# Altium footprint library ATROTECH.PcbLib: 334 footprints (part 5 of 21)
Each footprint in its own frame and in the unit in brackets; x right, y up, seen from the top. Pads: shape width x height; smd on the part's side, far side on the other; paste and mask are expansions set on the pad; w line width, h text height; cw(c..) or ccw(c..) is an arc to the next point about the centre after c.
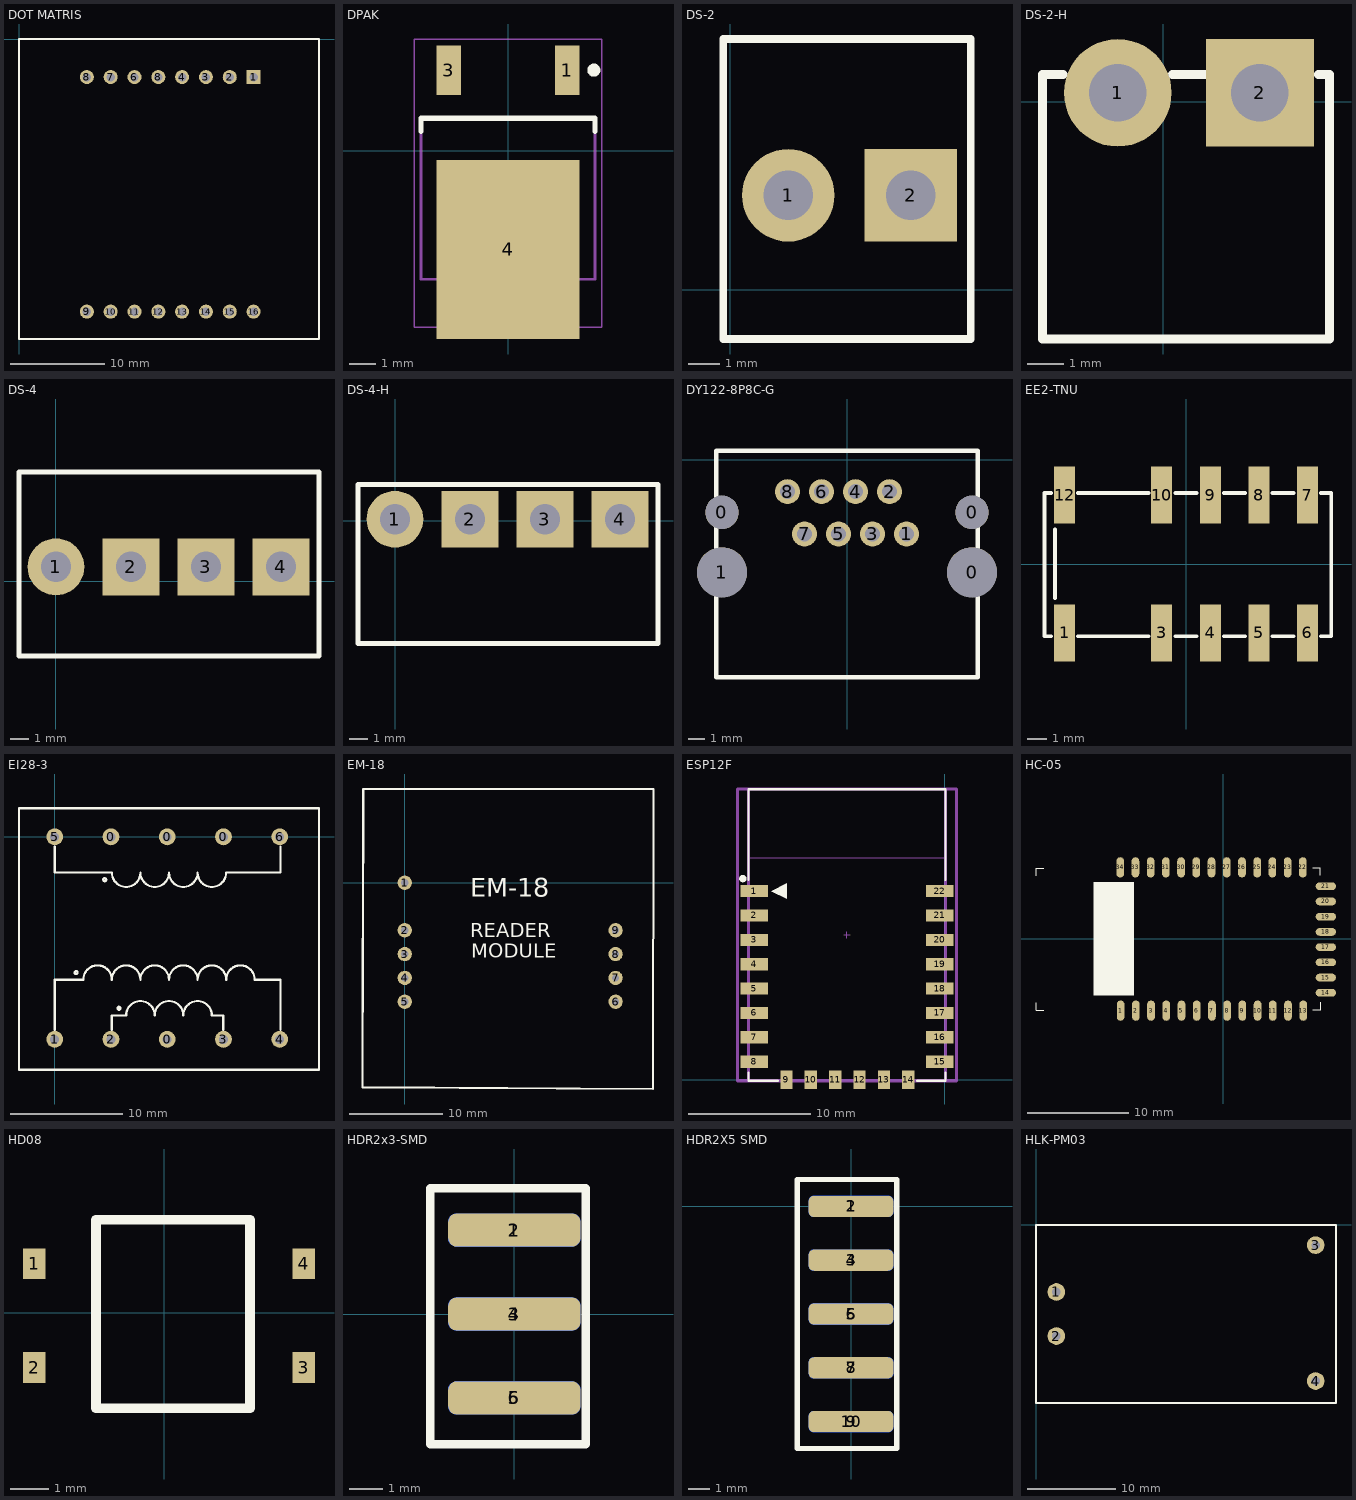
[diagram p4: the footprints below, top view; thin cyan lines are the x and y axes]

## DOT MATRIS [mm]
pads (16):
  rect 1.5x1.5 hole 0.9: 1(25.019,-4.064)
  round 1.5 hole 0.9: 2(22.479,-4.064) 3(19.939,-4.064) 4(17.399,-4.064) 6(12.319,-4.064) 7(9.779,-4.064) 8(7.239,-4.064) 8(14.859,-4.064) 9(7.239,-29.083) 10(9.779,-29.083) 11(12.319,-29.083) 12(14.859,-29.083) 13(17.399,-29.083) 14(19.939,-29.083) 15(22.479,-29.083) 16(25.019,-29.083)
Top Overlay:
  lines w0.2: 0,-32 32,-32 32,0 0,0 0,-32
3D body: height 8.25, standoff 0, extent -0.025,-32.004 32.029,0.09

## DPAK [mm]
pads (3):
  rect 0.95x1.9 smd: 1(2.28,3.1) 3(-2.28,3.1)
  rect 5.5x6.9 smd: 4(0,-3.8)
Top Overlay:
  circle w0.25: c3.305,3.1 r0.125
  lines w0.2: -3.35,0.75 -3.35,1.25 3.35,1.25 3.35,0.75
Mechanical 13:
  lines w0.1: -3.35,-4.95 -3.35,1.25 3.35,1.25 3.35,-4.95 -3.35,-4.95
Mechanical 15:
  lines w0.05: -3.6,-6.8 -3.6,4.3 3.6,4.3 3.6,-6.8 -3.6,-6.8
  lines w0.1: -0.5,-1.25 0.5,-1.25 ; 0,-1.75 0,-0.75
3D body "User Library-DPAK-1.step": height 2.34, standoff -0.07, extent -3.27,-6.528 3.27,3.411

## DS-2 [mm]
pads (2):
  round 3 hole 1.6: 1(1.87,3.048)
  rect 3x3 hole 1.6: 2(5.83,3.048)
Top Overlay:
  lines w0.254: -0.231,-1.599 -0.231,8.101 7.77,8.101 7.77,-1.599 -0.231,-1.599
3D body "User Library-Cvilux_CI5102P1V00.STEP": height 13.9, standoff -3.6, extent -0.15,-1.599 7.77,8.001

## DS-2-H [mm]
pads (2):
  round 3 hole 1.6: 1(-1.27,0.254)
  rect 3x3 hole 1.6: 2(2.69,0.254)
Top Overlay:
  lines w0.254: -2.794,0.762 -3.371,0.762 -3.371,-6.604 4.63,-6.604 4.63,0.762 4.318,0.762 ; 0.254,0.762 1.143,0.762
3D body "User Library-Cvilux_CI5102P1H00.STEP": height 9.6, standoff -3.6, extent -3.25,-18.577 4.67,0.793

## DS-4 [mm]
pads (4):
  round 3 hole 1.6: 1(0,0.762)
  rect 3x3 hole 1.6: 2(3.96,0.762) 3(7.92,0.762) 4(11.88,0.762)
Top Overlay:
  lines w0.254: -1.951,-3.937 13.889,-3.937 13.889,5.763 -1.951,5.763 -1.951,-3.937
3D body "User Library-Cvilux_CI5104P1V00.STEP": height 13.9, standoff -3.6, extent -1.951,-3.937 13.889,5.663

## DS-4-H [mm]
pads (4):
  round 3 hole 1.6: 1(-0.029,0.079)
  rect 3x3 hole 1.6: 2(3.931,0.079) 3(7.891,0.079) 4(11.851,0.079)
Top Overlay:
  lines w0.254: -1.98,-6.477 13.86,-6.477 13.86,1.905 -1.98,1.905 -1.98,-6.477
3D body "User Library-Cvilux_CI5104P1H00.STEP": height 9.6, standoff -3.6, extent -1.98,-18.704 13.86,0.666

## DY122-8P8C-G [mm]
pads (12):
  round 2 hole 2: 0(-7.502,-3.145) 0(7.498,-3.145)
  round 3 hole 3: 0(7.498,-6.745) 1(-7.502,-6.745)
  round 1.5 hole 0.9: 1(3.568,-4.445) 2(2.548,-1.905) 3(1.528,-4.445) 4(0.508,-1.905) 5(-0.512,-4.445) 6(-1.532,-1.905) 7(-2.552,-4.445) 8(-3.572,-1.905)
Top Overlay:
  lines w0.254: -7.852,-13.045 7.848,-13.045 7.848,0.555 -7.852,0.555 -7.852,-13.045

## EE2-TNU [mm]
pads (10):
  rect 1.1x3 smd: 1(-6.35,-3.61) 3(-1.27,-3.61) 4(1.27,-3.61) 5(3.81,-3.61) 6(6.35,-3.61) 7(6.35,3.61) 8(3.81,3.61) 9(1.27,3.61) 10(-1.27,3.61) 12(-6.35,3.61)
Top Overlay:
  lines w0.2: -7.05,-3.785 -7.4,-3.785 -7.4,3.71 -7.05,3.71 ; -6.85,-1.79 -6.85,1.81 ; -5.65,-3.785 -1.95,-3.785 ; -5.65,3.71 -1.95,3.71 ; -0.55,-3.785 0.55,-3.785 ; -0.55,3.71 0.55,3.71 ; 1.99,-3.785 3.09,-3.785 ; 1.99,3.71 3.09,3.71 ; 4.53,-3.785 5.63,-3.785 ; 4.53,3.71 5.63,3.71 ; 7.05,-3.785 7.6,-3.785 7.6,3.71 7.05,3.71

## EI28-3 [mm]
pads (10):
  round 1.5 hole 0.8: 0(5,0) 0(10,-18) 0(10,0) 0(15,0) 1(0,-18) 2(5,-18) 3(15,-18) 4(20,-18) 5(0,0) 6(20,0)
Top Overlay:
  circle w0.2: c4.445,-3.81 r0.127
  circle w0.2: c5.715,-15.24 r0.127
  circle w0.2: c1.905,-12.065 r0.127
  lines w0.2: 0,-17.145 0,-12.7 2.54,-12.7 cw(c3.81,-12.694) 5.08,-12.7 cw(c6.35,-12.694) 7.62,-12.7 cw(c8.89,-12.694) 10.16,-12.7 cw(c11.43,-12.694) 12.7,-12.7 cw(c13.97,-12.694) 15.24,-12.7 cw(c16.51,-12.694) 17.78,-12.7 20.066,-12.7 20.066,-17.145 ; 0,-0.889 0,-3.175 5.08,-3.175 ccw(c6.35,-3.181) 7.62,-3.175 ccw(c8.89,-3.181) 10.16,-3.175 ccw(c11.43,-3.181) 12.7,-3.175 ccw(c13.97,-3.181) 15.24,-3.175 20.066,-3.175 20.066,-0.889 ; 5.08,-17.145 5.08,-15.875 6.35,-15.875 cw(c7.62,-15.869) 8.89,-15.875 cw(c10.16,-15.869) 11.43,-15.875 cw(c12.7,-15.869) 13.97,-15.875 14.986,-15.875 14.986,-17.145 ; -3.175,-20.701 -3.175,2.54 23.495,2.54 23.495,-20.701 -3.175,-20.701

## EM-18 [mil] "RFID Reader Module"
pads (9):
  round 60 hole 30: 1(0,0) 2(0,-200) 3(0,-300) 4(0,-400) 5(0,-500) 6(885.83,-500) 7(885.83,-400) 8(885.83,-300) 9(885.83,-200)
Top Overlay:
  lines w10: 1042.91,-866.86 -177.8,-860 -175,393.7 1045,393.7 1042.92,-865
  text "MODULE" at 280,-315 h60
  text "READER" at 275,-230 h60
  text "EM-18" at 275,-60 h78.74

## ESP12F [mm]
pads (22):
  rect 2.25x1 smd: 1(-15.655,15.492) 2(-15.655,13.492) 3(-15.655,11.492) 4(-15.655,9.492) 5(-15.655,7.492) 6(-15.655,5.492) 7(-15.655,3.492) 8(-15.655,1.492) 15(-0.405,1.492) 16(-0.405,3.492) 17(-0.405,5.492) 18(-0.405,7.492) 19(-0.405,9.492) 20(-0.405,11.492) 21(-0.405,13.492) 22(-0.405,15.492)
  rect 1x1.5 smd: 9(-13,0) 10(-11,0) 11(-9,0) 12(-7,0) 13(-5,0) 14(-3,0)
Top Overlay:
  circle w0.3: c-16.58,16.517 r0.15
  region: -14.26,15.492 -12.99,14.857 -12.99,16.127
  lines w0.2: -16.114,0.576 -16.114,-0.076 -13.724,-0.076 ; -16.114,16.408 -16.114,23.863 0.054,23.863 0.054,16.408 ; -2.276,-0.076 0.054,-0.076 0.054,0.576
Mechanical 13:
  lines w0.051: -16.157,18.219 -16.157,23.874 0.099,23.874 0.099,18.219 -16.157,18.219
  lines w0.254: -16.114,-0.076 0.054,-0.076 0.054,23.863 -16.114,23.863 -16.114,-0.076
  text "CUTOUT POLYGON" at -13.6,19.3 h0.8
  text "ANTENNA AREA" at -13.081,21.209 h0.8
Mechanical 15:
  lines w0.1: -8.284,11.893 -7.776,11.893 ; -8.03,11.639 -8.03,12.147
  lines w0.254: -17.005,-0.076 -17.005,23.863 0.945,23.863 0.945,-0.076 -17.005,-0.076
3D body "ESP_12_E.STEP": height 2.75, standoff 0.04, extent -16.029,0.001 -0.029,24.001

## HC-05 [mm]
pads (34):
  oval 0.76x2 smd: 1(-10.095,-7.06) 2(-8.595,-7.06) 3(-7.095,-7.06) 4(-5.595,-7.06) 5(-4.095,-7.06) 6(-2.595,-7.06) 7(-1.095,-7.06) 8(0.405,-7.06) 9(1.905,-7.06) 10(3.405,-7.06) 11(4.905,-7.06) 12(6.405,-7.06) 13(7.905,-7.06) 22(7.865,7.06) 23(6.365,7.06) 24(4.865,7.06) 25(3.365,7.06) 26(1.865,7.06) 27(0.365,7.06) 28(-1.135,7.06) 29(-2.635,7.06) 30(-4.135,7.06) 31(-5.635,7.06) 32(-7.135,7.06) 33(-8.635,7.06) 34(-10.135,7.06)
  oval 2x0.76 smd: 14(10.135,-5.3) 15(10.135,-3.8) 16(10.135,-2.3) 17(10.135,-0.8) 18(10.135,0.7) 19(10.135,2.2) 20(10.135,3.7) 21(10.135,5.2)
Top Overlay:
  region: -8.767,5.619 -12.767,5.619 -12.767,-5.581 -8.767,-5.581
  lines w0.1: -18.435,-6.28 -18.435,-7.03 -17.685,-7.03 ; -18.425,6.23 -18.425,6.98 -17.675,6.98 ; 8.82,7.025 9.57,7.025 9.57,6.275 ; 8.865,-6.98 9.615,-6.98 9.615,-6.23
3D body "User Library-Bluetooth HC-06_.SLDPRT": height 2.35, standoff 0, extent -18.41,-7.01 9.6,7.01

## HD08 [mm]
pads (4):
  rect 0.584x0.8 smd: 1(-3.381,1.27) 2(-3.381,-1.43) 3(3.619,-1.43) 4(3.619,1.27)
Top Overlay:
  lines w0.254: -1.778,-2.487 2.222,-2.487 2.222,2.413 -1.778,2.413 -1.778,-2.487

## HDR2x3-SMD [mm]
pads (6):
  rrect50% 4x1 smd: 1(0,2.54) 3(0,0) 5(0,-2.54)
  rrect50% 4x1 smd far side: 2(0,2.54) 4(0,0) 6(0,-2.54)
Top Overlay:
  lines w0.254: -2.54,-3.937 2.159,-3.937 2.159,3.81 -2.54,3.81 -2.54,-3.937

## HDR2X5 SMD [mm]
pads (10):
  rrect50% 4x1 smd: 1(0,0) 3(0,-2.54) 5(0,-5.08) 7(0,-7.62) 9(0,-10.16)
  rrect50% 4x1 smd far side: 2(0,0) 4(0,-2.54) 6(0,-5.08) 8(0,-7.62) 10(0,-10.16)
Top Overlay:
  lines w0.254: -2.54,-11.43 -2.54,1.27 2.159,1.27 2.159,-11.43 -2.54,-11.43

## HLK-PM03 [mm]
height 15
pads (4):
  round 2 hole 1: 1(2.3,-7.6) 2(2.3,-12.6) 3(31.7,-2.3) 4(31.7,-17.7)
Top Overlay:
  lines w0.254: 0,-20.2 34,-20.2 34,0 0,0 0,-20.2
3D body "User Library-HLK-PM01.step": height 15.1, standoff -5, extent 0,-20.2 34,0